# Altium footprint library u025Library.PcbLib: 132 footprints (part 1 of 9)
Each footprint in its own frame and in the unit in brackets; x right, y up, seen from the top. Pads: shape width x height; smd on the part's side, far side on the other; paste and mask are expansions set on the pad; w line width, h text height; cw(c..) or ccw(c..) is an arc to the next point about the centre after c.
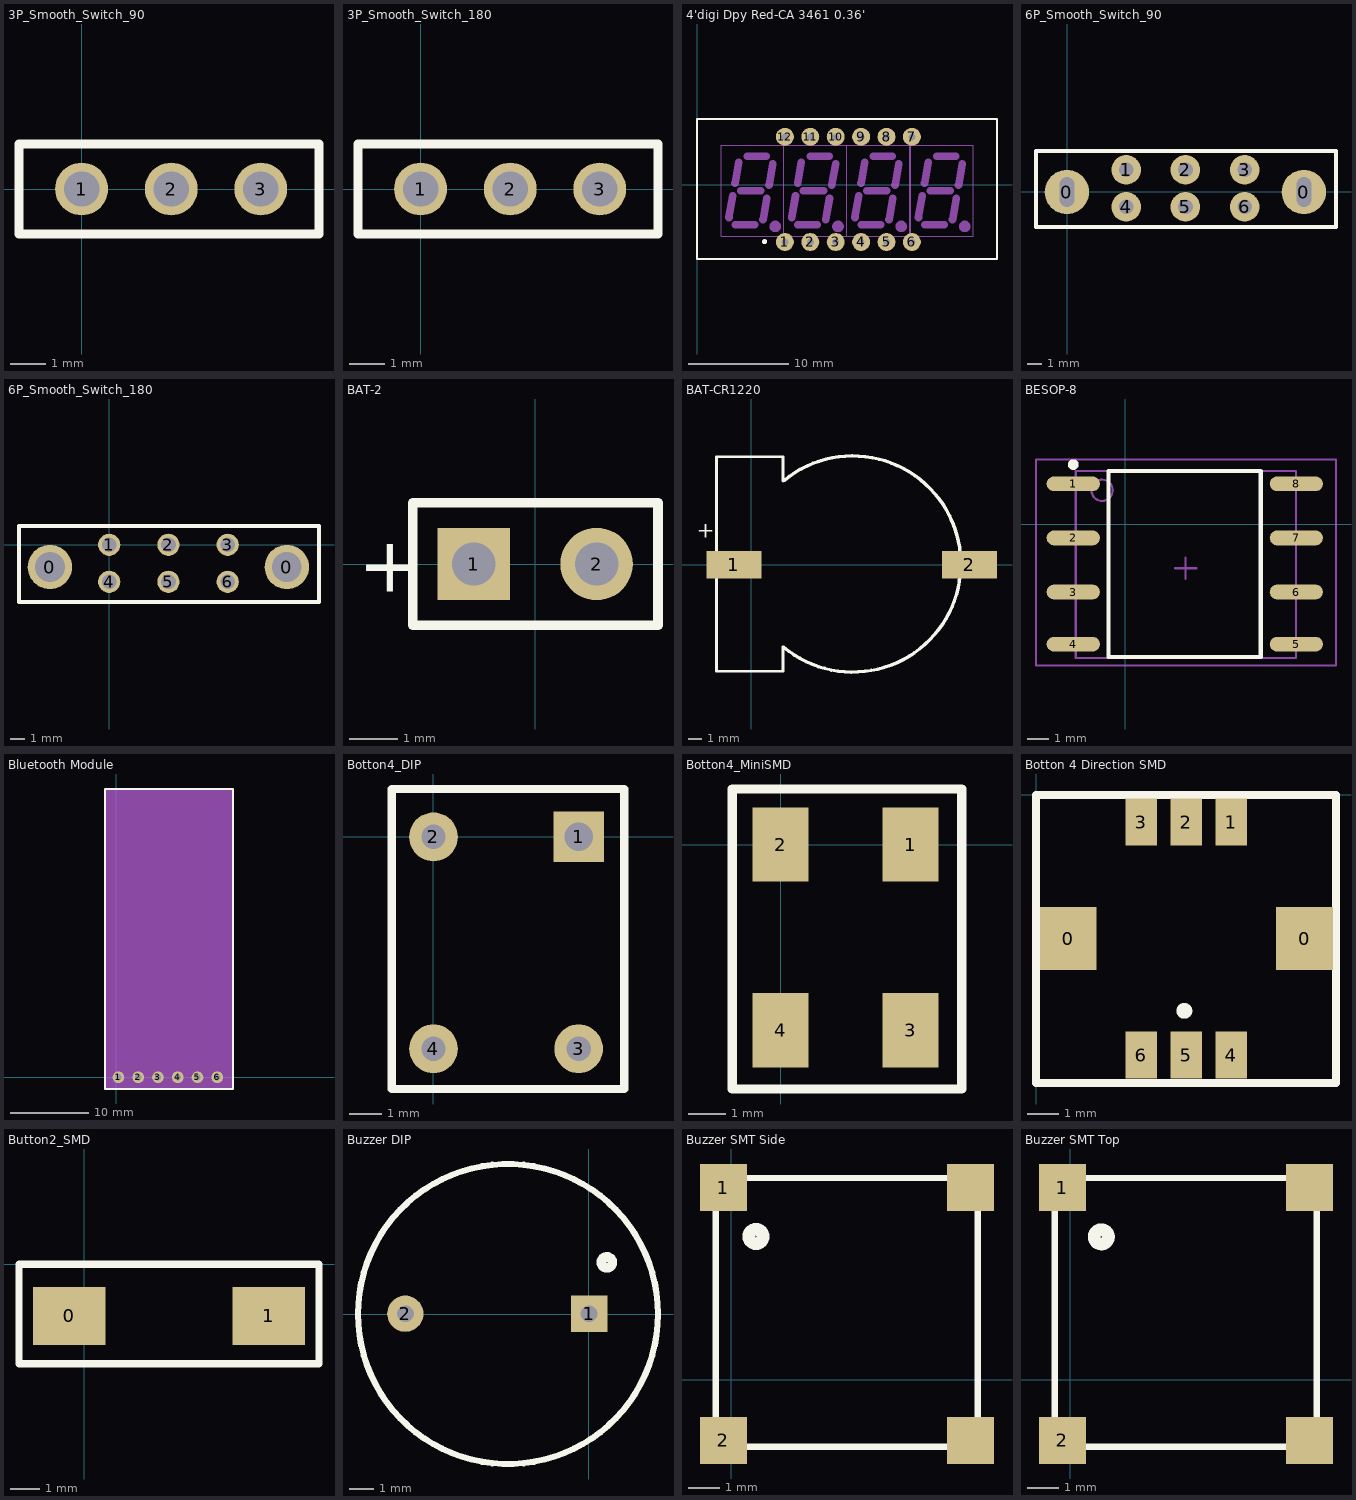
[diagram p0: the footprints below, top view; thin cyan lines are the x and y axes]

## 3P_Smooth_Switch_90 [mm] "3P_Smooth_Switch_90"
pads (3):
  round 1.5 hole 1: 1(0,0) 2(2.54,0) 3(5.08,0)
Top Overlay:
  lines w0.254: -1.778,-1.27 6.731,-1.27 6.731,1.27 -1.778,1.27 -1.778,-1.27
3D body: height 10.6, standoff -3.37, extent -4.51,-3.734 9.64,3.766

## 3P_Smooth_Switch_180 [mm] "3P_Smooth_Switch_180"
pads (3):
  round 1.5 hole 1: 1(0,0) 2(2.54,0) 3(5.08,0)
Top Overlay:
  lines w0.254: -1.778,-1.27 -1.778,1.27 6.731,1.27 6.731,-1.27 -1.778,-1.27
3D body: height 5.25, standoff -3.85, extent -4.33,-12.266 8.67,0.634

## 4'digi Dpy Red-CA 3461 0.36' [mm] "4-Digi LED, 7-Segment Display"
height 1.2
pads (12):
  round 1.8 hole 0.7: 1(8.763,-5.747) 2(11.303,-5.747) 3(13.843,-5.747) 4(16.383,-5.747) 5(18.923,-5.747) 6(21.463,-5.747) 7(21.463,4.775) 8(18.923,4.775) 9(16.383,4.775) 10(13.843,4.775) 11(11.303,4.775) 12(8.763,4.775)
Top Overlay:
  circle w0.25: c6.733,-5.715 r0.125
  lines w0.2: -0.025,-7.445 29.972,-7.445 29.972,6.55 -0.025,6.55 -0.025,-7.445
Mechanical 1:
  circle w0.86: c7.8,-4.191 r0.15
  circle w0.86: c14.074,-4.191 r0.15
  circle w0.86: c20.399,-4.191 r0.15
  circle w0.86: c26.749,-4.191 r0.15
  lines w0.762: 3.169,-3.3 3.549,-1.13 ; 3.779,0.15 4.139,2.23 ; 3.799,-4.04 5.719,-4.04 ; 4.355,-0.61 6.363,-0.61 ; 5.019,2.82 6.909,2.82 ; 6.579,-3.5 6.949,-1.37 ; 7.179,-0.05 7.559,2.08 ; 9.443,-3.3 9.823,-1.13 ; 10.053,0.15 10.413,2.23 ; 10.073,-4.04 11.993,-4.04 ; 10.629,-0.61 12.637,-0.61 ; 11.293,2.82 13.183,2.82 ; 12.853,-3.5 13.223,-1.37 ; 13.453,-0.05 13.833,2.08 ; 15.768,-3.3 16.148,-1.13 ; 16.378,0.15 16.738,2.23 ; 16.398,-4.04 18.318,-4.04 ; 16.954,-0.61 18.962,-0.61 ; 17.618,2.82 19.508,2.82 ; 19.178,-3.5 19.548,-1.37 ; 19.778,-0.05 20.158,2.08 ; 22.118,-3.3 22.498,-1.13 ; 22.728,0.15 23.088,2.23 ; 22.748,-4.04 24.668,-4.04 ; 23.304,-0.61 25.312,-0.61 ; 23.968,2.82 25.858,2.82 ; 25.528,-3.5 25.898,-1.37 ; 26.128,-0.05 26.508,2.08
Mechanical 13:
  lines w0.1: 2.375,-5.156 8.661,-5.156 8.661,3.937 2.375,3.937 2.375,-5.156 ; 8.648,-5.156 14.935,-5.156 14.935,3.937 8.648,3.937 8.648,-5.156 ; 14.973,-5.156 21.26,-5.156 21.26,3.937 14.973,3.937 14.973,-5.156 ; 21.323,-5.156 27.61,-5.156 27.61,3.937 21.323,3.937 21.323,-5.156
3D body: height 6.34, standoff 0, extent 2.375,-5.156 8.712,3.886
3D body: height 6.34, standoff 0, extent 21.323,-5.156 27.661,3.886
3D body: height 6.34, standoff 0, extent 14.973,-5.156 21.311,3.886
3D body: height 6.34, standoff 0, extent 8.648,-5.156 14.986,3.886

## 6P_Smooth_Switch_90 [mm] "6P_Smooth_Switch_90"
pads (8):
  round 3 hole 1 slot 2 at 90 deg: 0(-0.028,-0.028) 0(15.972,-0.028)
  round 2 hole 1: 1(3.972,1.472) 2(7.972,1.472) 3(11.972,1.472) 4(3.972,-1.028) 5(7.972,-1.028) 6(11.972,-1.028)
Top Overlay:
  lines w0.254: -2.117,-2.39 18.139,-2.39 18.139,2.742 -2.117,2.742 -2.117,-2.39
3D body: height 9.65, standoff -2.6, extent 0.744,-2.621 14.744,3.579

## 6P_Smooth_Switch_180 [mm] "6P_Smooth_Switch_180"
pads (8):
  round 3 hole 2: 0(-4,-1.5) 0(12,-1.5)
  round 1.5 hole 1: 1(0,0) 2(4,0) 3(8,0) 4(0,-2.5) 5(4,-2.5) 6(8,-2.5)
Top Overlay:
  lines w0.254: -6.089,-3.862 -6.089,1.27 14.166,1.27 14.166,-3.862 -6.089,-3.862

## BAT-2 [mm] "Battery; 2 Leads"
pads (2):
  rect 1.5x1.5 hole 0.9: 1(-1.27,0)
  round 1.5 hole 0.9: 2(1.27,0)
Top Overlay:
  lines w0.2: -2.54,-1.27 2.54,-1.27 2.54,1.27 -2.54,1.27 -2.54,-1.27
  text "+" at -3.67,-0.577 h1.15

## BAT-CR1220 [mm] "Battery; CR1220"
pads (2):
  rect 4x2 smd: 1(-1.27,0) 2(15.852,0)
Top Overlay:
  lines w0.2: 2.308,-7.739 -2.54,-7.739 -2.54,7.85 2.308,7.85 2.308,6.094 ; 2.308,-7.706 2.308,-5.95
  lines w0.254: 2.341,-5.982 ccw(c7.366,0.061) 2.38,6.135
  text "+" at -3.951,1.961 h1.15
3D body: height 3.94, standoff -1, extent -2.081,-7.375 16.419,7.622

## BESOP-8 [mm] "BESOP  8-Leads, Body 6.6x9.76mm, Pitch 2.54mm,"
height 3.5
pads (8):
  oval 2.5x0.7 smd: 1(-2.45,1.905) 2(-2.45,-0.635) 3(-2.45,-3.175) 4(-2.45,-5.625) 5(8.02,-5.625) 6(8.02,-3.175) 7(8.02,-0.635) 8(8.02,1.905)
Top Overlay:
  circle w0.25: c-2.45,2.805 r0.125
  lines w0.2: 6.325,-6.223 -0.8,-6.223 -0.8,2.5 6.325,2.5 ; 6.35,-6.223 6.35,2.5
Mechanical 13:
  circle w0.1: c-1.1,1.6 r0.5
  lines w0.1: -2.337,-6.274 8.001,-6.274 8.001,2.5 -2.337,2.5 -2.337,-6.274
Mechanical 15:
  lines w0.1: 2.319,-2.057 3.319,-2.057 ; 2.819,-2.557 2.819,-1.557 ; -4.2,-6.629 -4.2,3.051 9.881,3.051 9.881,-6.629 -4.2,-6.629
3D body: height 5.08, standoff 0, extent -2.458,-6.759 7.842,3.151

## Bluetooth Module [mm] "Bluetooth Module"
height 4
pads (6):
  round 1.5 hole 0.8: 1(0.28,0) 2(2.82,0) 3(5.36,0) 4(7.9,0) 5(10.44,0) 6(12.98,0)
Top Overlay:
  lines w0.254: -1.478,-1.5 -1.478,37.064 15.037,37.064 15.037,-1.5 -1.478,-1.5
Mechanical 1:
  rectangle: -1.478,-1.5 15.037,37.064
3D body: height 4.3, standoff 1.97, extent 0.718,9.066 12.834,27.214

## Botton4_DIP [mil] "Botton4_DIP"
height 196.85
pads (4):
  rect 62x62 hole 35: 1(178.58,0)
  round 60 hole 30: 2(0,0) 3(178.58,-260.63) 4(0,-260.63)
Top Overlay:
  lines w10: -51.32,-310.13 234.68,-310.13 234.68,58.87 -51.32,58.87 -51.32,-310.13
3D body: height 192.91, standoff -141.39, extent -24.22,-290.86 212,22.86

## Botton4_MiniSMD [mm] "Botton4_MiniSMD"
height 5
pads (4):
  rect 1.5x2 smd: 1(3.5,0) 2(0,0) 3(3.5,-5) 4(0,-5)
Top Overlay:
  lines w0.254: -1.304,-6.582 -1.304,1.495 4.884,1.495 4.884,-6.582 -1.304,-6.582
3D body: height 2.51, standoff -0.09, extent -0.004,-5.02 3.196,-0.12

## Botton 4 Direction SMD [mm] "Botton 4 Direction SMD"
height 5
pads (8):
  rect 1.8x2 smd: 0(1.014,-4.567) 0(8.52,-4.567)
  rect 1x1.5 smd: 1(6.189,-0.867) 2(4.764,-0.867) 3(3.339,-0.867) 4(6.189,-8.267) 5(4.764,-8.267) 6(3.339,-8.267)
Top Overlay:
  circle w0.25: c4.705,-6.861 r0.125
  lines w0.254: -0.008,-9.15 -0.008,-0.008 9.517,-0.008 9.517,-9.15 -0.008,-9.15

## Button2_SMD [mm] "Button2_SMD"
height 4
pads (2):
  rect 2.5x2 smd: 0(-0.508,-1.778) 1(6.35,-1.778)
Top Overlay:
  lines w0.254: -2.235,-3.429 -2.235,0 8.077,0 8.077,-3.429 -2.235,-3.429
3D body: height 4.3, standoff 0, extent -2.052,-3.553 8.148,-0.053

## Buzzer DIP [mm] "Buzzer DIP"
height 6
pads (2):
  rect 1.5x1.5 hole 0.7: 1(0.009,0.011)
  round 1.5 hole 0.7: 2(-7.591,0.011)
Top Overlay:
  circle w0.254: c-3.347,0 r6.2
  circle w0.4: c0.738,2.134 r0.227
3D body: height 9.65, standoff -4.5, extent -9.658,-6.025 5.796,5.975

## Buzzer SMT Side [mm] "Buzzer SMT Side"
height 3
pads (4):
  rect 1.5x1.5 smd: 1(-0.254,6.096) 2(-0.254,-1.93) ""(7.595,6.096) ""(7.595,-1.93)
Top Overlay:
  circle w0.4: c0.779,4.545 r0.227
  lines w0.2: -0.5,1.8 -0.5,6.4 7.823,6.4 7.823,-2.134 -0.5,-2.134 -0.5,2.04
3D body: height 3, standoff 0, extent -0.508,-2.159 7.823,6.35

## Buzzer SMT Top [mm] "Buzzer SMT Top"
height 3
pads (4):
  rect 1.5x1.5 smd: 1(-0.254,6.096) 2(-0.254,-1.93) ""(7.595,6.096) ""(7.595,-1.93)
Top Overlay:
  circle w0.4: c0.981,4.533 r0.227
  lines w0.2: -0.5,1.8 -0.5,6.4 7.823,6.4 7.823,-2.134 -0.5,-2.134 -0.5,2.04
3D body: height 3, standoff 0, extent -0.508,-2.159 7.823,6.35